# Altium footprint library modulos.PcbLib: 9 footprints
Each footprint in its own frame and in the unit in brackets; x right, y up, seen from the top. Pads: shape width x height; smd on the part's side, far side on the other; paste and mask are expansions set on the pad; w line width, h text height; cw(c..) or ccw(c..) is an arc to the next point about the centre after c.
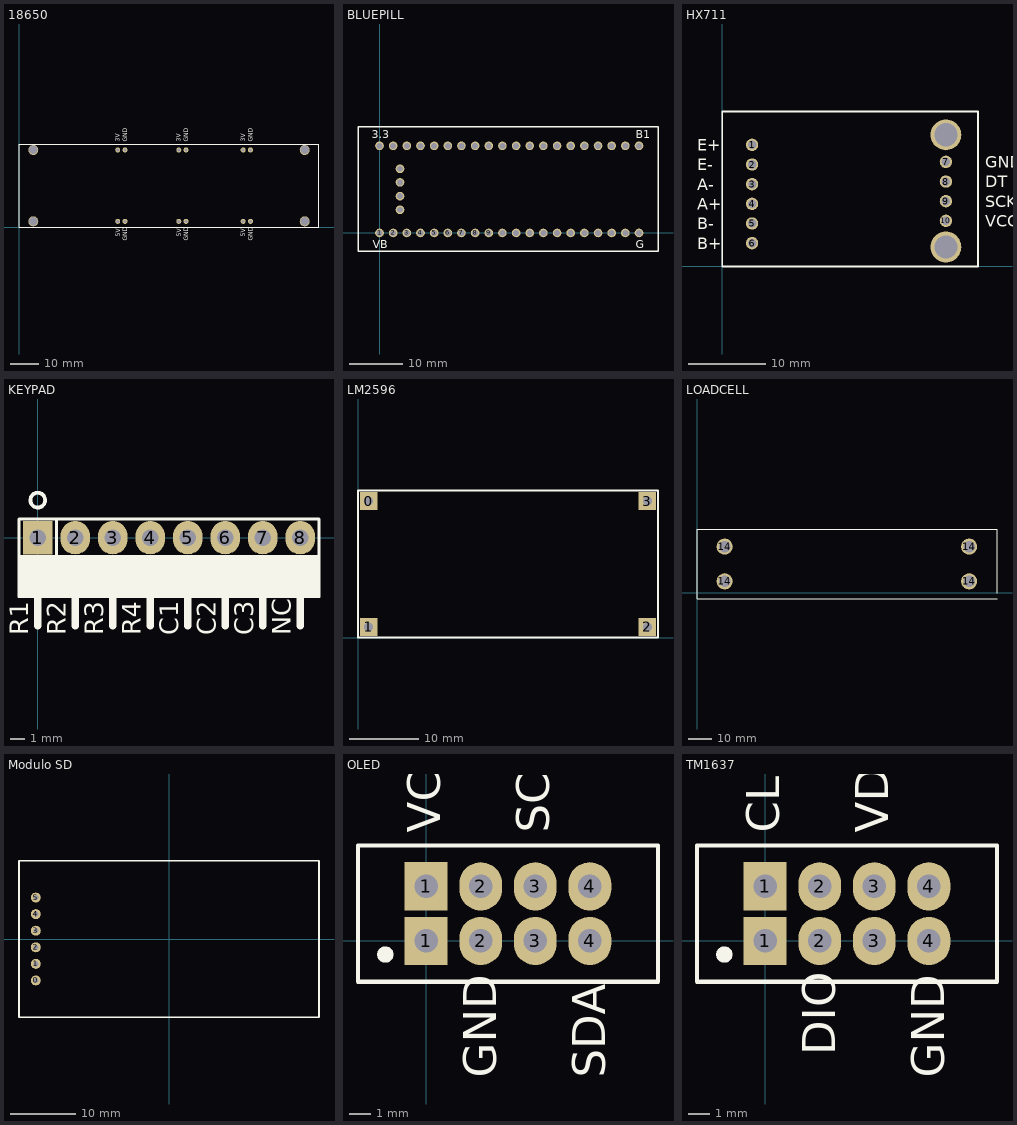
[diagram p0: the footprints below, top view; thin cyan lines are the x and y axes]

## 18650 [mm]
pads (16):
  round 1.75 hole 1.1: 1(34.56,2) 2(37.1,2) 3(55.92,2) 4(58.46,2) 5(78.46,2) 6(81,2) 7(81,27) 8(78.46,27) 9(58.46,27) 10(55.92,27) 11(37.1,27) 12(34.56,27)
  round 3.5 hole 3: ""(5,2) ""(5,27) ""(100,2) ""(100,27)
Top Overlay:
  lines w0.254: 0,0 0,29 105,29 105,0 0,0
  text "GND" at 81.755,29.877 h1.52
  text "3V" at 79.215,29.877 h1.52
  text "GND" at 59.215,29.877 h1.52
  text "3V" at 56.675,29.877 h1.52
  text "3V" at 35.315,29.877 h1.52
  text "GND" at 37.855,29.877 h1.52
  text "5V" at 79.257,-3.378 h1.52
  text "GND" at 81.797,-4.75 h1.52
  text "5V" at 56.717,-3.378 h1.52
  text "GND" at 59.257,-4.75 h1.52
  text "GND" at 37.897,-4.75 h1.52
  text "5V" at 35.357,-3.378 h1.52
3D body "Wemos Battery Shield V3.step": height 20.24, standoff -3, extent -2.941,-0.127 102.108,30.776

## BLUEPILL [mm]
pads (44):
  round 1.6 hole 1.1: 1(0,0) 2(2.54,0) 3(5.08,0) 4(7.62,0) 5(10.16,0) 6(12.7,0) 7(15.24,0) 8(17.78,0) 9(20.32,0) 10(22.86,0) 11(25.4,0) 12(27.94,0) 13(30.48,0) 14(33.02,0) 15(35.56,0) 16(38.1,0) 17(40.64,0) 18(43.18,0) 19(45.72,0) 20(48.26,0) 21(48.26,16.205) 22(45.72,16.205) 23(43.18,16.205) 24(40.64,16.205) 25(38.1,16.205) 26(35.56,16.205) 27(33.02,16.205) 28(30.48,16.205) 29(27.94,16.205) 30(25.4,16.205) 31(22.86,16.205) 32(20.32,16.205) 33(17.78,16.205) 34(15.24,16.205) 35(12.7,16.205) 36(10.16,16.205) 37(7.62,16.205) 38(5.08,16.205) 39(2.54,16.205) 40(0,16.205) 41(3.81,4.318) 42(3.81,6.858) 43(3.81,9.398) 44(3.81,11.938)
Top Overlay:
  lines w0.254: -4,-3.353 51.791,-3.353 51.791,19.71 -4,19.71 -4,-3.353
  text "VB" at -1.295,-2.87 h1.52
  text "G" at 47.65,-2.87 h1.52
  text "B1" at 47.65,17.653 h1.52
  text "3.3" at -1.397,17.653 h1.52
3D body "STM32F103C8T6_Blue_Pill v6.step": height 9.77, standoff -8.5, extent -5.817,-3.302 51.743,19.558

## HX711 [mm]
pads (12):
  round 1.6 hole 1.1: 1(3.85,15.7) 2(3.85,13.16) 3(3.85,10.62) 4(3.85,8.08) 5(3.85,5.54) 6(3.85,3) 7(28.9,13.5) 8(28.9,10.96) 9(28.9,8.42) 10(28.9,5.88)
  round 4 hole 3: ""(28.9,2.5) ""(28.9,17)
Top Overlay:
  lines w0.254: 0,0 33.02,0 33.02,19.99 0,19.99 0,0
  text "GND" at 33.98,12.738 h1.52
  text "DT" at 33.98,10.198 h1.52
  text "SCK" at 33.98,7.658 h1.52
  text "VCC" at 33.98,5.118 h1.52
  text "B+" at -3.262,2.238 h1.52
  text "B-" at -3.262,4.778 h1.52
  text "A+" at -3.262,7.318 h1.52
  text "A-" at -3.262,9.858 h1.52
  text "E-" at -3.262,12.398 h1.52
  text "E+" at -3.262,14.938 h1.52
3D body "HX711 Breakout v7.step": height 3.05, standoff -8.34, extent -0.447,-0.711 33.553,20.289

## KEYPAD [mm]
pads (8):
  rect 2x2.25 hole 1.1: 1(0,0)
  oval 2x2.25 hole 1.1: 2(2.54,0) 3(5.08,0) 4(7.62,0) 5(10.16,0) 6(12.7,0) 7(15.24,0) 8(17.78,0)
Top Overlay:
  rectangle: 16.51,-4 19.05,-1.27
  rectangle: 13.97,-4 16.51,-1.27
  rectangle: 11.43,-4 13.97,-1.27
  rectangle: 8.89,-4 11.43,-1.27
  rectangle: 6.35,-4 8.89,-1.27
  rectangle: 3.81,-4 6.35,-1.27
  rectangle: 1.27,-4 3.81,-1.27
  rectangle: -1.27,-4 1.27,-1.27
  lines w0.2: 1.27,1.27 1.27,-1.27 ; -1.27,-1.27 -1.27,-4 1.27,-4 ; -1.27,-1.27 19.05,-1.27 ; -1.27,-1.27 -1.27,1.27 19.05,1.27 19.05,-1.27 ; 1.27,-4 3.81,-4 ; 1.27,-4 1.27,-1.27 ; 1.27,-4 1.27,-1.27 ; 3.81,-4 6.35,-4 ; 3.81,-4 3.81,-1.27 3.81,-4 ; 6.35,-4 8.89,-4 ; 6.35,-4 6.35,-1.27 6.35,-4 ; 8.89,-4 11.43,-4 ; 8.89,-4 8.89,-1.27 8.89,-4 ; 11.43,-4 13.97,-4 ; 11.43,-4 11.43,-1.27 11.43,-4 ; 13.97,-4 16.51,-4 ; 13.97,-4 13.97,-1.27 13.97,-4 ; 16.51,-4 19.05,-4 19.05,-1.27 ; 16.51,-4 16.51,-1.27 16.51,-4
  lines w0.254: 0.497,2.598 ccw(c0,2.54) 0.5,2.54
  lines w0.508: 0,-5.969 0,-4.064 ; 2.54,-5.969 2.54,-4.064 ; 5.08,-5.969 5.08,-4.064 ; 7.62,-5.969 7.62,-4.064 ; 10.16,-5.969 10.16,-4.064 ; 12.7,-5.969 12.7,-4.064 ; 15.24,-5.969 15.24,-4.064 ; 17.78,-5.969 17.78,-4.064
  text "C1" at 9.525,-6.604 h1.25
  text "C2" at 12.065,-6.604 h1.25
  text "C3" at 14.605,-6.604 h1.25
  text "R4" at 6.985,-6.604 h1.25
  text "R3" at 4.445,-6.604 h1.25
  text "R2" at 1.905,-6.604 h1.25
  text "R1" at -0.635,-6.604 h1.25
  text "NC" at 17.145,-6.604 h1.25
3D body "Matrix Keypad 12 Key (4X3).STEP": height 1.31, standoff 0, extent -18.186,-85.49 35.814,-8.49
3D body "SIP4.step": height 8.38, standoff -2.54, extent -1.27,-1.27 8.89,1.27
3D body "SIP4.step": height 8.38, standoff -2.54, extent 8.89,-1.27 19.05,1.27

## LM2596 [mil]
pads (4):
  rect 100x100 hole 50: 0(60,774) 1(60,60) 2(1641,60) 3(1641,774)
Top Overlay:
  lines w10: 0,0 1701,0 1701,834 0,834 0,0
3D body "LM2596 DC to DC Buck Converter 3 A.STEP": height 525.59, standoff -70.87, extent 0,0 1700.79,836.61

## LOADCELL [mm]
pads (4):
  round 7 hole 5: 14(12,5) 14(12,20.019) 14(117.921,5) 14(117.921,20.019)
Top Overlay:
  lines w0.254: 130,-2.5 0,-2.5 0,27.5 130,27.5 130,-0.25
3D body "loadcell_fh03.STEP": height 22, standoff 0, extent -0.054,-2.464 129.946,42.536

## Modulo SD [mil]
pads (6):
  round 60 hole 30: 0(-804,-250) 1(-804,-150) 2(-804,-50) 3(-804,50) 4(-804,150) 5(-804,250)
Top Overlay:
  lines w10: -905.51,-472.44 905.51,-472.44 905.51,472.44 -905.51,472.44 -905.51,-472.44
3D body: height 10, standoff 0, extent -395,34 -395,34
3D body: height 10, standoff 0, extent -542,-264 -542,-264
3D body: height 10, standoff 0, extent -505,-246 -505,-246
3D body "Product_TF Micro SD Card Memory Modul Arduino.STEP": height 318.9, standoff -132.3, extent -904,-472 741.67,472.89
3D body: height 10, standoff 0, extent -881,-449 -881,-449

## OLED [mm]
pads (8):
  rect 2x2.25 hole 1.1: 1(0,0) 1(0,2.54)
  oval 2x2.25 hole 1.1: 2(2.54,0) 2(2.54,2.54) 3(5.08,0) 3(5.08,2.54) 4(7.62,0) 4(7.62,2.54)
Top Overlay:
  circle w0.254: c-1.993,-0.635 r0.125
  circle w0.254: c-1.905,-0.635 r0.254
  lines w0.2: -3.175,-1.905 10.795,-1.905 10.795,4.445 -3.175,4.445 -3.175,-1.905
  text "SDA" at 8.331,-6.375 h1.52
  text "GND" at 3.251,-6.375 h1.52
  text "SCL" at 5.74,5.029 h1.52
  text "VCC" at 0.66,5.029 h1.52
3D body "oled.SLDPRT": height 2.5, standoff -0.1, extent -13.863,26.111 21.787,59.711
3D body "SIP3_2.step": height 10.1, standoff -1.5, extent -1.262,-1.295 6.358,3.785
3D body "SIP3_2.step": height 10.1, standoff -1.5, extent 1.278,-1.295 8.898,3.785
3D body "1483350-3.stp": height 23.3, standoff 14.95, extent -0.383,-0.696 8.077,29.804

## TM1637 [mm]
pads (8):
  rect 2x2.25 hole 1.1: 1(0,0) 1(0,2.54)
  oval 2x2.25 hole 1.1: 2(2.54,0) 2(2.54,2.54) 3(5.08,0) 3(5.08,2.54) 4(7.62,0) 4(7.62,2.54)
Top Overlay:
  circle w0.254: c-1.905,-0.635 r0.254
  circle w0.254: c-1.993,-0.635 r0.125
  lines w0.2: -3.175,-1.905 -3.175,4.445 10.795,4.445 10.795,-1.905 -3.175,-1.905
  text "GND" at 8.331,-6.375 h1.52
  text "DIO" at 3.251,-5.323 h1.52
  text "VDD" at 5.74,5.029 h1.52
  text "CLK" at 0.66,5.029 h1.52
3D body "1483350-3.stp": height 23.3, standoff 14.95, extent -0.115,-0.823 8.345,29.677
3D body "SIP3_2.step": height 10.1, standoff -1.5, extent 1.278,-1.295 8.898,3.785
3D body "SIP3_2.step": height 10.1, standoff -1.5, extent -1.262,-1.295 6.358,3.785
3D body "YAAJ_4_Digit_LED_Display_0.36_Dots_TM1637_cp.step": height 9.1, standoff -2.2, extent -6.782,25.629 15.818,71.129